# Altium footprint library Intelliclone.PcbLib: 372 footprints (part 2 of 24)
Each footprint in its own frame and in the unit in brackets; x right, y up, seen from the top. Pads: shape width x height; smd on the part's side, far side on the other; paste and mask are expansions set on the pad; w line width, h text height; cw(c..) or ccw(c..) is an arc to the next point about the centre after c.
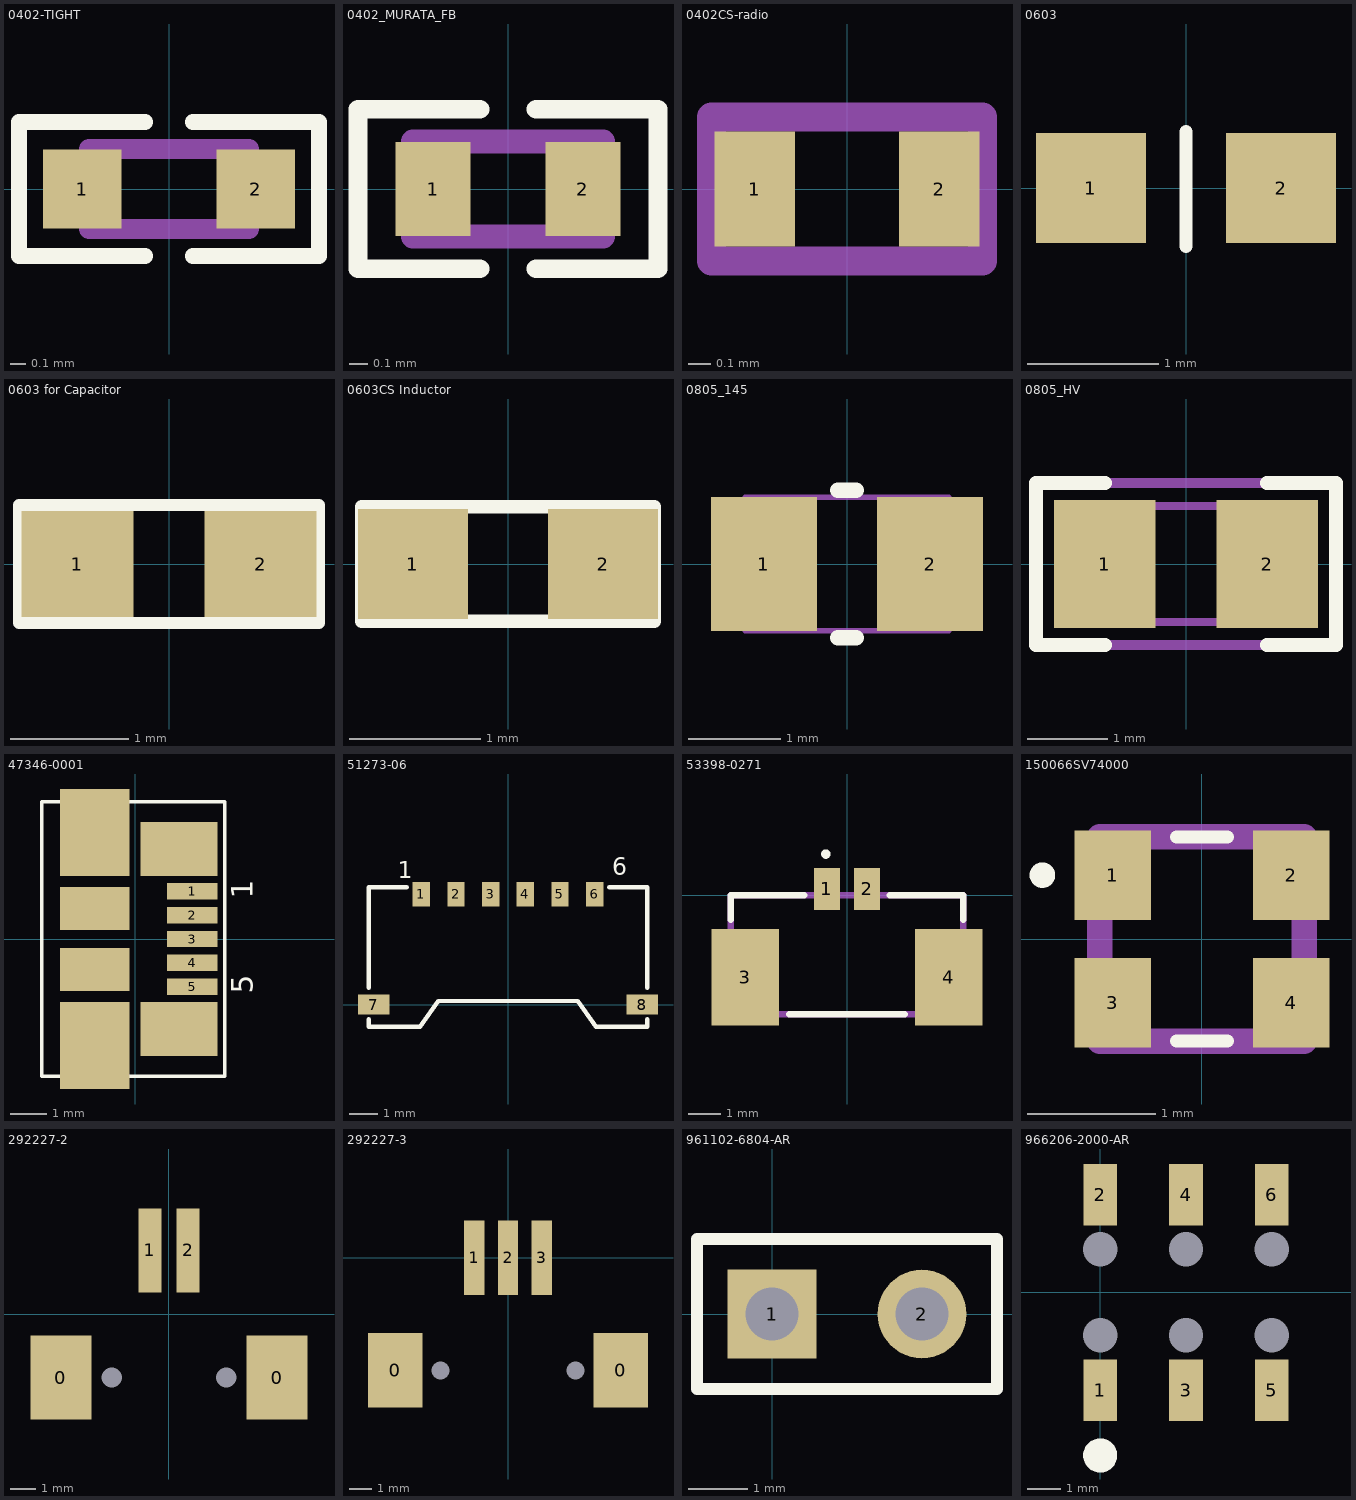
[diagram p1: the footprints below, top view; thin cyan lines are the x and y axes]

## 0402-TIGHT [mm] "For packing"
height 0.5
pads (2):
  rect 0.5x0.5 smd: 1(-0.55,0) 2(0.55,0)
Top Overlay:
  lines w0.1: -0.15,-0.425 -0.951,-0.425 -0.951,0.425 -0.15,0.425 ; 0.15,-0.425 0.951,-0.425 0.951,0.425 0.15,0.425
Mechanical 13:
  lines w0.127: -0.508,-0.254 0.508,-0.254 0.508,0.254 -0.508,0.254 -0.508,-0.254
3D body "CAP 0402.STEP": height 0.52, standoff -0.01, extent -0.5,-0.27 0.5,0.254

## 0402_MURATA_FB [mm] "For packing"
height 0.5
pads (2):
  rect 0.4x0.5 smd: 1(-0.4,0) 2(0.4,0)
Top Overlay:
  lines w0.1: -0.15,-0.425 -0.8,-0.425 -0.8,0.425 -0.15,0.425 ; 0.15,-0.425 0.8,-0.425 0.8,0.425 0.15,0.425
Mechanical 13:
  lines w0.127: -0.508,-0.254 0.508,-0.254 0.508,0.254 -0.508,0.254 -0.508,-0.254
3D body "CAP 0402.STEP": height 0.52, standoff -0.01, extent -0.5,-0.27 0.5,0.254

## 0402CS-radio [mil] "Coilcraft Inductor"
height 26
pads (2):
  rect 14x20 smd: 1(-16,0) 2(16,0)
Mechanical 13:
  lines w5: -23.5,-12.5 23.5,-12.5 23.5,12.5 -23.5,12.5 -23.5,-12.5
3D body "RES0402.stp": height 11.81, standoff 0, extent -19.68,-9.84 19.69,9.85

## 0603 [mil] "Standard 0603 Component Footprint"
height 53.15
pads (2):
  rect 33x33 smd: 1(-28.56,0) 2(28.56,0)
Top Overlay:
  lines w4.02: 0,-17.5 0,17
3D body "RES0603.stp": height 17.72, standoff 0, extent -31.99,-15.74 31,15.76

## 0603 for Capacitor [mm] "Chip Capacitor, 2-Leads, Body 1.6x0.8mm, IPC Medium Density"
height 0.8
pads (2):
  rect 0.95x0.9 smd: 1(-0.775,0) 2(0.775,0)
Top Overlay:
  lines w0.1: -1.27,-0.5 -1.27,0.5 1.27,0.5 1.27,-0.5 -1.27,-0.5
3D body "CAP 0603.STEP": height 0.82, standoff -0.01, extent -0.8,-0.406 0.8,0.418

## 0603CS Inductor [mil]
height 53.15
pads (2):
  rect 33x33 smd: 1(-28.56,0) 2(28.56,0)
Top Overlay:
  lines w4.02: -44,-17.25 44,-17.25 44,17.25 -44,17.25 -44,-17.25
3D body "CAP 0603.STEP": height 32.22, standoff -0.22, extent -31.5,-16 31.5,16.44

## 0805_145 [mm] "0805 / 1.45mm height"
height 1.45
pads (2):
  rect 1.15x1.45 smd: 1(-0.9,0) 2(0.9,0)
Top Overlay:
  lines w0.17: -0.1,-0.8 0.1,-0.8 ; -0.1,0.8 0.1,0.8
Mechanical 5:
  lines w0.06: -1.1,-0.725 -1.1,0.725 1.1,0.725 1.1,-0.725 -1.1,-0.725
  text ".Designator" at 0.508,0.254 h0.53
3D body: height 1.4, standoff 0, extent 0.501,-0.724 1.099,0.724
3D body: height 1.4, standoff 0, extent -0.499,-0.724 0.5,0.725
3D body: height 1.4, standoff 0, extent -1.099,-0.724 -0.501,0.724

## 0805_HV [mil] "0805 with 30mil clearance between pads"
height 43.31
pads (2):
  rect 50x63 smd: 1(-40,0) 2(40,0)
Top Overlay:
  lines w7: -40,-40 -74,-40 -74,0 -74,40 -40,40 ; 40,-40 74,-40 74,0 74,40 40,40
Mechanical 5:
  lines w5: -74,-40 -74,40 74,40 74,-40 -74,-40
  text ".Designator" at -64,-17 h35
Mechanical 13:
  lines w3.94: -25.59,-28.54 -25.59,28.54 ; 25.59,-28.54 25.59,28.54 ; -43.31,-28.54 43.31,-28.54 43.31,28.54 -43.31,28.54 -43.31,-28.54
3D body: height 43.31, standoff 0, extent -43.29,-28.52 -25.61,28.52
3D body: height 43.31, standoff 0, extent -25.57,-28.52 25.57,28.52
3D body: height 43.31, standoff 0, extent 25.61,-28.52 43.29,28.52

## 47346-0001 [mm] "CONN RCPT 5POS MICRO USB R/A"
pads (11):
  rect 1.38x0.45 smd: 1(1.56,1.3) 2(1.56,0.65) 3(1.56,0) 4(1.56,-0.65) 5(1.56,-1.3)
  rect 1.9x2.37 smd: ""(-1.1,-2.91) ""(-1.1,2.91)
  rect 1.9x1.175 smd: ""(-1.1,-0.837) ""(-1.1,0.837)
  rect 2.1x1.475 smd: ""(1.2,-2.462) ""(1.2,2.462)
Top Overlay:
  lines w0.102: -2.55,-3.75 -2.55,3.75 2.45,3.75 2.45,-3.75 -2.55,-3.75
  text "5" at 3.4,-1.5 h1
  text "1" at 3.4,1.1 h1
3D body "473460001.stp": height 2.47, standoff -0.47, extent -3.43,-3.98 2,4

## 51273-06 [mm] "6 pin battery connector"
pads (8):
  rect 0.6x0.85 smd: 1(-3,3.825) 2(-1.8,3.825) 3(-0.6,3.825) 4(0.6,3.825) 5(1.8,3.825) 6(3,3.825)
  rect 1.09x0.7 smd: 7(-4.65,0) 8(4.65,0)
Top Overlay:
  lines w0.152: -4.826,-0.508 -4.826,-0.762 -3.048,-0.762 -2.413,0.127 0,0.127 2.413,0.127 3.048,-0.762 4.826,-0.762 4.826,-0.508 ; -4.826,0.584 -4.826,4.064 -3.505,4.064 ; 3.505,4.064 4.826,4.064 4.826,0.584
  text "1" at -3.81,4.166 h1.02
  text "6" at 3.607,4.293 h1.02
3D body "S-51273-00601-001.stp": height 1.51, standoff 0.06, extent -5.03,-0.531 5.03,4.019

## 53398-0271 [mm]
pads (4):
  rect 0.8x1.3 smd: 1(-0.625,0.2) 2(0.625,0.2)
  rect 2.1x3 smd: 3(-3.175,-2.55) 4(3.175,-2.55)
Top Overlay:
  circle w0.2: c-0.661,1.286 r0.045
  lines w0.2: -3.625,-0.761 -3.625,0 -1.337,0 ; -1.8,-3.7 1.8,-3.7 ; 1.337,0 3.625,0 3.625,-0.761
Mechanical 15:
  lines w0.2: -3.625,-3.7 3.625,-3.7 3.625,0 -3.625,0 -3.625,-3.7
3D body "533980271.stp": height 4.71, standoff -0.03, extent -3.825,-3.7 3.825,0.5

## 150066SV74000 [mm] "LED GREEN/RED CLEAR SMD"
pads (4):
  rect 0.6x0.7 smd: 1(-0.7,0.5) 2(0.7,0.5) 3(-0.7,-0.5) 4(0.7,-0.5)
Top Overlay:
  lines w0.1: -0.2,-0.8 0.2,-0.8 ; -0.2,0.8 0.2,0.8 ; -1.3,0.5 cw(c-1.25,0.5) -1.2,0.5 cw(c-1.25,0.5) -1.3,0.5
Mechanical 15:
  lines w0.2: -0.8,-0.8 -0.8,0.8 0.8,0.8 0.8,-0.8 -0.8,-0.8
3D body "STEP-WL-SBCW-0606-rev1.stp": height 0.7, standoff 0, extent -0.8,-0.8 0.8,0.8

## 292227-2 [mm] "CONN HEADER 3POS R/A SMD TIN"
pads (6):
  rect 2.4x3.3 smd: 0(-4.25,-2.5) 0(4.25,-2.5)
  rect 0x0 hole 0.8 unplated: 0(-2.25,-2.5) 0(2.25,-2.5)
  rect 0.9x3.3 smd: 1(-0.75,2.5) 2(0.75,2.5)
3D body "c-0292227-02-a-3d.stp": height 4.95, standoff -0.75, extent -4.7,-5.75 4.7,3.45

## 292227-3 [mm] "CONN HEADER 3POS R/A SMD TIN"
pads (7):
  rect 2.4x3.3 smd: 0(-5,-5) 0(5,-5)
  rect 0x0 hole 0.8 unplated: 0(-3,-5) 0(3,-5)
  rect 0.9x3.3 smd: 1(-1.5,0) 2(0,0) 3(1.5,0)
3D body "c-0292227-03-a-3d.stp": height 4.95, standoff -0.75, extent -5.399,-8.306 5.501,0.894

## 961102-6804-AR [mm] "2 Positions Header, Unshrouded Connector 0.100\" (2.54mm) Through Hole Gold"
pads (2):
  rect 1.5x1.5 hole 0.9: 1(0,0)
  round 1.5 hole 0.9: 2(2.54,0)
Top Overlay:
  lines w0.2: -1.27,-1.27 -1.27,1.27 3.81,1.27 3.81,-1.27 -1.27,-1.27
3D body "961102-6804-XX.stp": height 8.8, standoff -3.8, extent -1.25,-1.25 3.83,1.25

## 966206-2000-AR [mm]
pads (18):
  rect 0x0 hole 1.02 unplated: 0(0,-1.27) 0(0,-1.27) 0(0,1.27) 0(0,1.27) 0(2.54,-1.27) 0(2.54,-1.27) 0(2.54,1.27) 0(2.54,1.27) 0(5.08,-1.27) 0(5.08,-1.27) 0(5.08,1.27) 0(5.08,1.27)
  rect 1x1.82 smd: 1(0,-2.89) 2(0,2.89) 3(2.54,-2.89) 4(2.54,2.89) 5(5.08,-2.89) 6(5.08,2.89)
Top Overlay:
  circle w0.5: c0,-4.826 r0.254
3D body "HLE-103-02-G-DV-BE.stp": height 3.71, standoff 0.05, extent -1.27,-3.289 6.35,3.289